# Altium footprint library LukaLIBRARY.PcbLib: 772 footprints (part 49 of 49)
Each footprint in its own frame and in the unit in brackets; x right, y up, seen from the top. Pads: shape width x height; smd on the part's side, far side on the other; paste and mask are expansions set on the pad; w line width, h text height; cw(c..) or ccw(c..) is an arc to the next point about the centre after c.
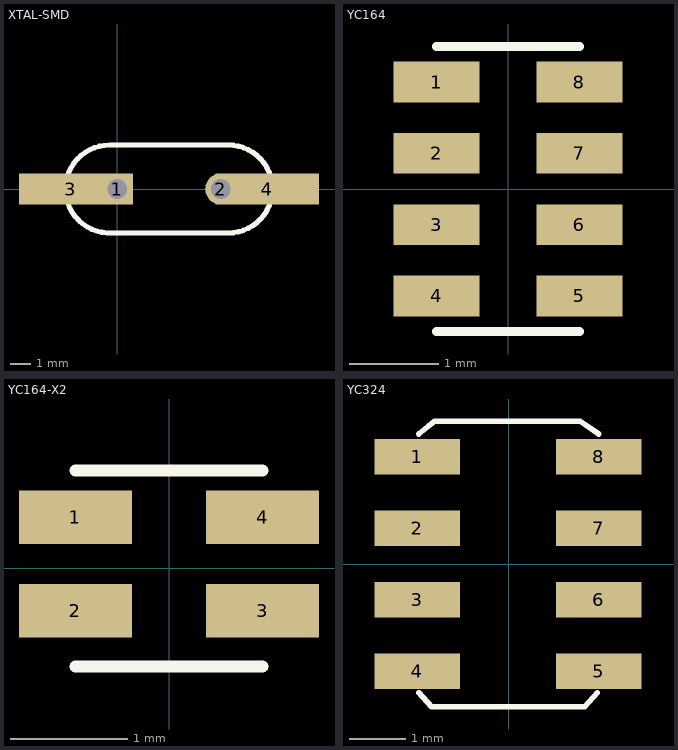
[diagram p48: the footprints below, top view; thin cyan lines are the x and y axes]

## XTAL-SMD [mil]
pads (4):
  rect 60x60 hole 38 mask-1000: 1(0,0)
  round 60 hole 38 mask-1000: 2(200,0)
  rect 200x60 smd mask-1000: 3(-90,0) 4(290,0)
Top Overlay:
  lines w10: -10,-85 215,-85 ccw(c215,0) 215,85 -15,85 ccw(c-15,0) -9.96,-84.85
Top Solder:
  region: 190,-30 390,-30 390,30 190,30
  region: 200,30.26 192.17,29.23 184.87,26.2 178.6,21.4 173.79,15.13 170.77,7.83 169.74,0 170.77,-7.83 173.79,-15.13 178.6,-21.4 184.87,-26.2 192.17,-29.23 200,-30.26 207.83,-29.23 215.13,-26.2 221.4,-21.4 226.21,-15.13 229.23,-7.83 230.26,0 229.23,7.83 226.21,15.13 221.4,21.4 215.13,26.2 207.83,29.23
  region: -190,-30 10,-30 10,30 -190,30
  region: -30,-30 30,-30 30,30 -30,30
Bottom Solder:
  region: 200,30.26 192.17,29.23 184.87,26.2 178.6,21.4 173.79,15.13 170.77,7.83 169.74,0 170.77,-7.83 173.79,-15.13 178.6,-21.4 184.87,-26.2 192.17,-29.23 200,-30.26 207.83,-29.23 215.13,-26.2 221.4,-21.4 226.21,-15.13 229.23,-7.83 230.26,0 229.23,7.83 226.21,15.13 221.4,21.4 215.13,26.2 207.83,29.23
  region: -30,-30 30,-30 30,30 -30,30

## YC164 [mm]
pads (8):
  rect 0.965x0.457 smd mask-25.4: 1(-0.8,1.2) 2(-0.8,0.4) 3(-0.8,-0.4) 4(-0.8,-1.2) 5(0.8,-1.2) 6(0.8,-0.4) 7(0.8,0.4) 8(0.8,1.2)
Top Overlay:
  lines w0.1: -0.8,-1.6 0.8,-1.6 ; -0.8,1.6 0.8,1.6
Top Solder:
  region: -1.283,0.171 -0.317,0.171 -0.317,0.629 -1.283,0.629
  region: -1.283,-0.629 -0.317,-0.629 -0.317,-0.171 -1.283,-0.171
  region: -1.283,-1.429 -0.317,-1.429 -0.317,-0.971 -1.283,-0.971
  region: -1.283,0.971 -0.317,0.971 -0.317,1.429 -1.283,1.429
  region: 0.317,0.171 1.283,0.171 1.283,0.629 0.317,0.629
  region: 0.317,-0.629 1.283,-0.629 1.283,-0.171 0.317,-0.171
  region: 0.317,-1.429 1.283,-1.429 1.283,-0.971 0.317,-0.971
  region: 0.317,0.971 1.283,0.971 1.283,1.429 0.317,1.429

## YC164-X2 [mil]
pads (4):
  rect 38x18 smd mask-1000: 1(-31.5,17.24) 2(-31.5,-14.25) 3(31.5,-14.25) 4(31.5,17.24)
Top Overlay:
  lines w3.94: -31.5,-32.99 31.5,-32.99 ; -31.5,32.99 31.5,32.99
Top Solder:
  region: -50.5,-23.25 -12.5,-23.25 -12.5,-5.25 -50.5,-5.25
  region: -50.5,8.24 -12.5,8.24 -12.5,26.24 -50.5,26.24
  region: 12.5,-23.25 50.5,-23.25 50.5,-5.25 12.5,-5.25
  region: 12.5,8.24 50.5,8.24 50.5,26.24 12.5,26.24

## YC324 [mil]
pads (8):
  rect 60x25 smd mask-1000: 1(-64.1,75) 2(-64.1,25) 3(-64.1,-25) 4(-64.1,-75) 5(62.9,-75) 6(62.9,-25) 7(62.9,25) 8(62.9,75)
Top Overlay:
  lines w3.94: -63,-90 -54,-100 53,-100 62,-90 ; -63,91 -52,100 50,100 63,91
Top Solder:
  region: -94.1,62.5 -34.1,62.5 -34.1,87.5 -94.1,87.5
  region: 32.9,62.5 92.9,62.5 92.9,87.5 32.9,87.5
  region: 32.9,12.5 92.9,12.5 92.9,37.5 32.9,37.5
  region: 32.9,-37.5 92.9,-37.5 92.9,-12.5 32.9,-12.5
  region: 32.9,-87.5 92.9,-87.5 92.9,-62.5 32.9,-62.5
  region: -94.1,-87.5 -34.1,-87.5 -34.1,-62.5 -94.1,-62.5
  region: -94.1,-37.5 -34.1,-37.5 -34.1,-12.5 -94.1,-12.5
  region: -94.1,12.5 -34.1,12.5 -34.1,37.5 -94.1,37.5